# Altium footprint library Microcontroller ARM.PcbLib: 42 footprints (part 2 of 3)
Each footprint in its own frame and in the unit in brackets; x right, y up, seen from the top. Pads: shape width x height; smd on the part's side, far side on the other; paste and mask are expansions set on the pad; w line width, h text height; cw(c..) or ccw(c..) is an arc to the next point about the centre after c.
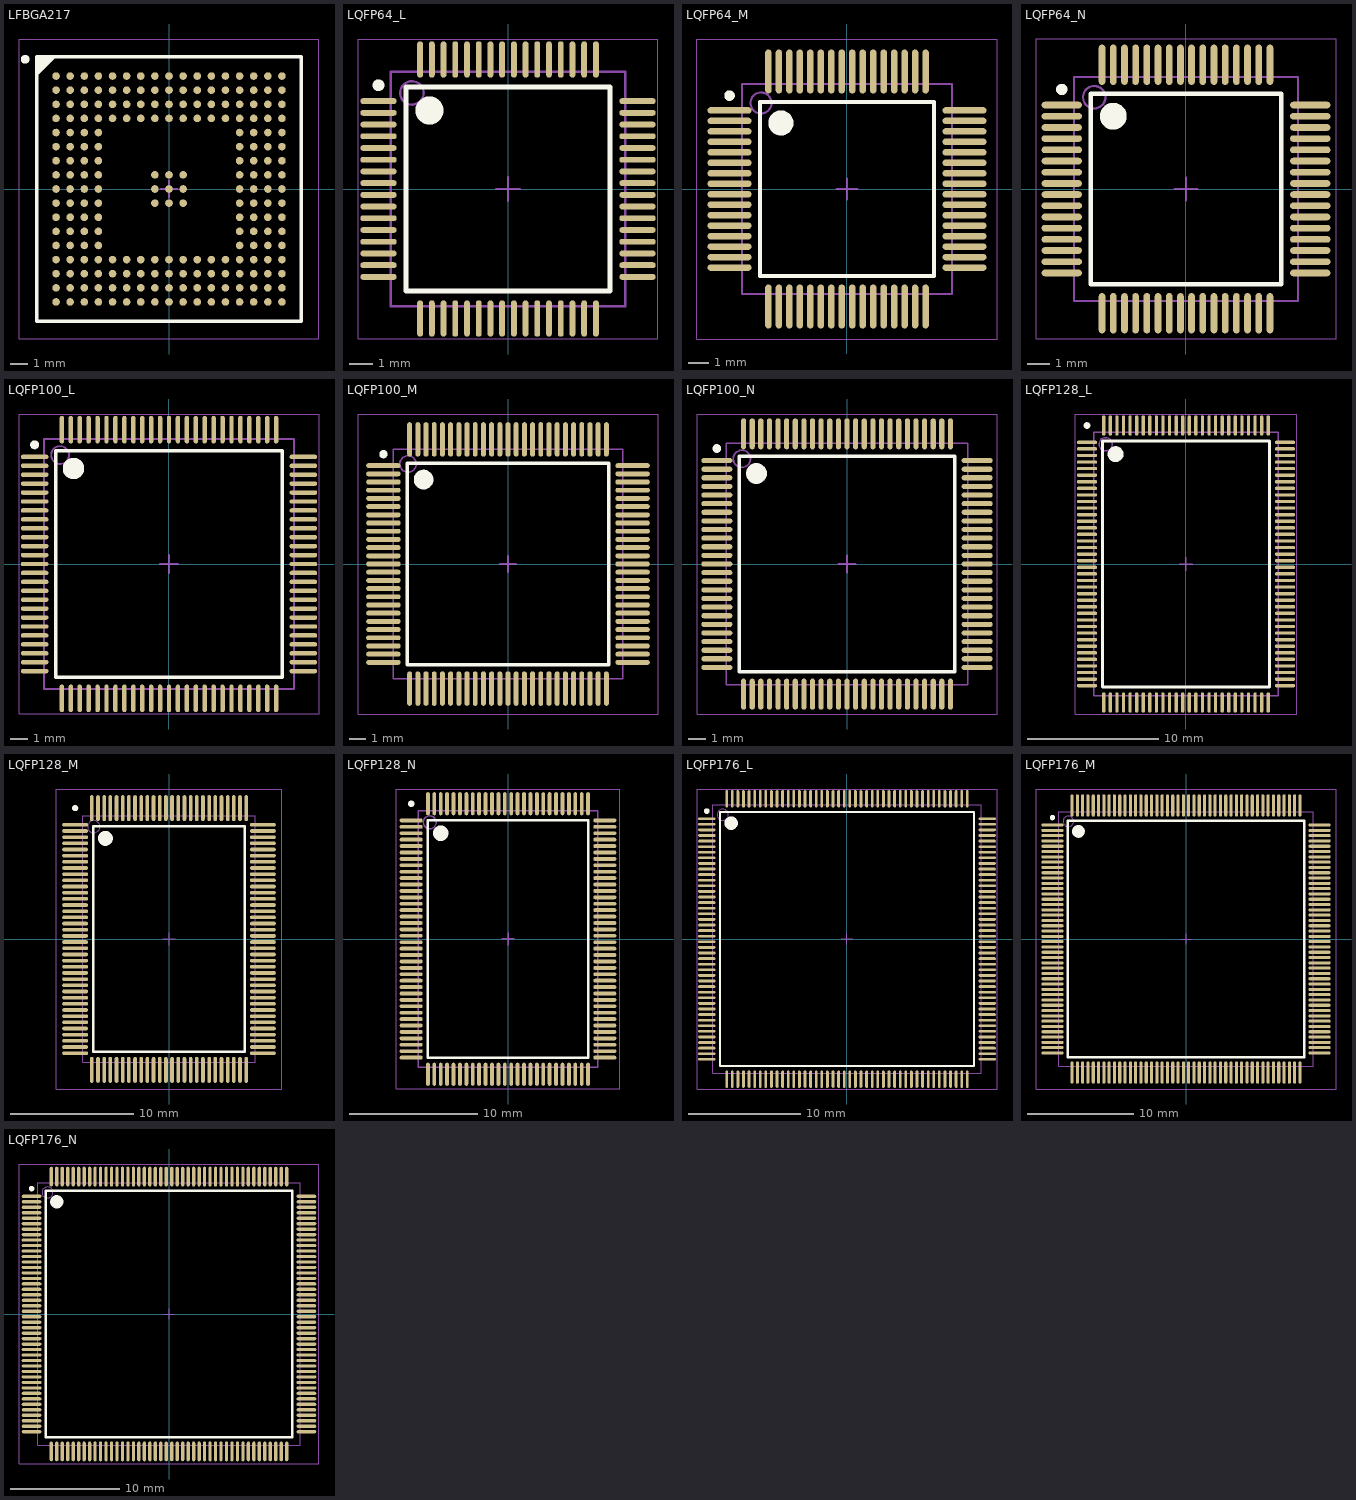
[diagram p1: the footprints below, top view; thin cyan lines are the x and y axes]

## LFBGA217 [mm] "BGA, 208-Leads, Body 15x15mm, Pitch 0.8mmBGA, 208-Leads, Body 15x15mm, Pitch 0.8mm, Solder Mask Defined Pads"
height 1.4
pads (217):
  round 0.43 smd mask-0.065: A1(-6.4,6.4) A2(-5.6,6.4) A3(-4.8,6.4) A4(-4,6.4) A5(-3.2,6.4) A6(-2.4,6.4) A7(-1.6,6.4) A8(-0.8,6.4) A9(0,6.4) A10(0.8,6.4) A11(1.6,6.4) A12(2.4,6.4) A13(3.2,6.4) A14(4,6.4) A15(4.8,6.4) A16(5.6,6.4) A17(6.4,6.4) B1(-6.4,5.6) B2(-5.6,5.6) B3(-4.8,5.6) B4(-4,5.6) B5(-3.2,5.6) B6(-2.4,5.6) B7(-1.6,5.6) B8(-0.8,5.6) B9(0,5.6) B10(0.8,5.6) B11(1.6,5.6) B12(2.4,5.6) B13(3.2,5.6) B14(4,5.6) B15(4.8,5.6) B16(5.6,5.6) B17(6.4,5.6) C1(-6.4,4.8) C2(-5.6,4.8) C3(-4.8,4.8) C4(-4,4.8) C5(-3.2,4.8) C6(-2.4,4.8) C7(-1.6,4.8) C8(-0.8,4.8) C9(0,4.8) C10(0.8,4.8) C11(1.6,4.8) C12(2.4,4.8) C13(3.2,4.8) C14(4,4.8) C15(4.8,4.8) C16(5.6,4.8) C17(6.4,4.8) D1(-6.4,4) D2(-5.6,4) D3(-4.8,4) D4(-4,4) D5(-3.2,4) D6(-2.4,4) D7(-1.6,4) D8(-0.8,4) D9(0,4) D10(0.8,4) D11(1.6,4) D12(2.4,4) D13(3.2,4) D14(4,4) D15(4.8,4) D16(5.6,4) D17(6.4,4) E1(-6.4,3.2) E2(-5.6,3.2) E3(-4.8,3.2) E4(-4,3.2) E14(4,3.2) E15(4.8,3.2) E16(5.6,3.2) E17(6.4,3.2) F1(-6.4,2.4) F2(-5.6,2.4) F3(-4.8,2.4) F4(-4,2.4) F14(4,2.4) F15(4.8,2.4) F16(5.6,2.4) F17(6.4,2.4) G1(-6.4,1.6) G2(-5.6,1.6) G3(-4.8,1.6) G4(-4,1.6) G14(4,1.6) G15(4.8,1.6) G16(5.6,1.6) G17(6.4,1.6) H1(-6.4,0.8) H2(-5.6,0.8) H3(-4.8,0.8) H4(-4,0.8) H8(-0.8,0.8) H9(0,0.8) H10(0.8,0.8) H14(4,0.8) H15(4.8,0.8) H16(5.6,0.8) H17(6.4,0.8) J1(-6.4,0) J2(-5.6,0) J3(-4.8,0) J4(-4,0) J8(-0.8,0) J9(0,0) J10(0.8,0) J14(4,0) J15(4.8,0) J16(5.6,0) J17(6.4,0) K1(-6.4,-0.8) K2(-5.6,-0.8) K3(-4.8,-0.8) K4(-4,-0.8) K8(-0.8,-0.8) K9(0,-0.8) K10(0.8,-0.8) K14(4,-0.8) K15(4.8,-0.8) K16(5.6,-0.8) K17(6.4,-0.8) L1(-6.4,-1.6) L2(-5.6,-1.6) L3(-4.8,-1.6) L4(-4,-1.6) L14(4,-1.6) L15(4.8,-1.6) L16(5.6,-1.6) L17(6.4,-1.6) M1(-6.4,-2.4) M2(-5.6,-2.4) M3(-4.8,-2.4) M4(-4,-2.4) M14(4,-2.4) M15(4.8,-2.4) M16(5.6,-2.4) M17(6.4,-2.4) N1(-6.4,-3.2) N2(-5.6,-3.2) N3(-4.8,-3.2) N4(-4,-3.2) N14(4,-3.2) N15(4.8,-3.2) N16(5.6,-3.2) N17(6.4,-3.2) P1(-6.4,-4) P2(-5.6,-4) P3(-4.8,-4) P4(-4,-4) P5(-3.2,-4) P6(-2.4,-4) P7(-1.6,-4) P8(-0.8,-4) P9(0,-4) P10(0.8,-4) P11(1.6,-4) P12(2.4,-4) P13(3.2,-4) P14(4,-4) P15(4.8,-4) P16(5.6,-4) P17(6.4,-4) R1(-6.4,-4.8) R2(-5.6,-4.8) R3(-4.8,-4.8) R4(-4,-4.8) R5(-3.2,-4.8) R6(-2.4,-4.8) R7(-1.6,-4.8) R8(-0.8,-4.8) R9(0,-4.8) R10(0.8,-4.8) R11(1.6,-4.8) R12(2.4,-4.8) R13(3.2,-4.8) R14(4,-4.8) R15(4.8,-4.8) R16(5.6,-4.8) R17(6.4,-4.8) T1(-6.4,-5.6) T2(-5.6,-5.6) T3(-4.8,-5.6) T4(-4,-5.6) T5(-3.2,-5.6) T6(-2.4,-5.6) T7(-1.6,-5.6) T8(-0.8,-5.6) T9(0,-5.6) T10(0.8,-5.6) T11(1.6,-5.6) T12(2.4,-5.6) T13(3.2,-5.6) T14(4,-5.6) T15(4.8,-5.6) T16(5.6,-5.6) T17(6.4,-5.6) U1(-6.4,-6.4) U2(-5.6,-6.4) U3(-4.8,-6.4) U4(-4,-6.4) U5(-3.2,-6.4) U6(-2.4,-6.4) U7(-1.6,-6.4) U8(-0.8,-6.4) U9(0,-6.4) U10(0.8,-6.4) U11(1.6,-6.4) U12(2.4,-6.4) U13(3.2,-6.4) U14(4,-6.4) U15(4.8,-6.4) U16(5.6,-6.4) U17(6.4,-6.4)
Top Overlay:
  circle w0.25: c-8.15,7.35 r0.125
  region: -6.5,7.5 -7.5,6.5 -7.5,7.5
  lines w0.2: -7.5,6.5 -6.5,7.5 ; -7.5,-7.5 -7.5,7.5 7.5,7.5 7.5,-7.5 -7.5,-7.5
Mechanical 13:
  lines w0.1: -7.5,-7.5 -7.5,7.5 7.5,7.5 7.5,-7.5 -7.5,-7.5
Mechanical 15:
  lines w0.05: -8.5,-8.5 -8.5,8.5 8.5,8.5 8.5,-8.5 -8.5,-8.5
  lines w0.1: -0.5,0 0.5,0 ; 0,-0.5 0,0.5
3D body: height 1.1, standoff 0.3, extent -7.5,-7.5 7.5,7.5
3D body: height 0.38, standoff -0.02, extent 6.203,-5.8 6.597,-5.401
3D body: height 0.38, standoff -0.02, extent 6.203,-6.6 6.597,-6.201
3D body: height 0.38, standoff -0.02, extent 5.403,-5.8 5.797,-5.401
3D body: height 0.38, standoff -0.02, extent 4.603,6.2 4.997,6.599
3D body: height 0.38, standoff -0.02, extent 5.403,-6.6 5.797,-6.201
3D body: height 0.38, standoff -0.02, extent 3.803,3.8 4.197,4.199
3D body: height 0.38, standoff -0.02, extent 4.603,3.8 4.997,4.199
3D body: height 0.38, standoff -0.02, extent 4.603,4.6 4.997,4.999
3D body: height 0.38, standoff -0.02, extent 3.803,4.6 4.197,4.999
3D body: height 0.38, standoff -0.02, extent 4.603,5.4 4.997,5.799
3D body: height 0.38, standoff -0.02, extent 6.203,-5 6.597,-4.601
3D body: height 0.38, standoff -0.02, extent 3.003,-4.2 3.397,-3.801
3D body: height 0.38, standoff -0.02, extent 5.403,-5 5.797,-4.601
3D body: height 0.38, standoff -0.02, extent 2.203,-5 2.597,-4.601
3D body: height 0.38, standoff -0.02, extent 2.203,-4.2 2.597,-3.801
3D body: height 0.38, standoff -0.02, extent 2.203,-6.6 2.597,-6.201
3D body: height 0.38, standoff -0.02, extent 3.003,-6.6 3.397,-6.201
3D body: height 0.38, standoff -0.02, extent 2.203,-5.8 2.597,-5.401
3D body: height 0.38, standoff -0.02, extent 3.003,-5.8 3.397,-5.401
3D body: height 0.38, standoff -0.02, extent 3.003,-5 3.397,-4.601
3D body: height 0.38, standoff -0.02, extent -6.6,4.603 -6.201,4.997
3D body: height 0.38, standoff -0.02, extent -5,4.603 -4.601,4.997
3D body: height 0.38, standoff -0.02, extent -3.4,3.803 -3.001,4.197
3D body: height 0.38, standoff -0.02, extent -2.6,3.803 -2.201,4.197
3D body: height 0.38, standoff -0.02, extent 1.4,-6.597 1.799,-6.203
3D body: height 0.38, standoff -0.02, extent 0.6,-6.597 0.999,-6.203
3D body: height 0.38, standoff -0.02, extent 1.4,-5.797 1.799,-5.403
3D body: height 0.38, standoff -0.02, extent -0.2,-5.797 0.199,-5.403
3D body: height 0.38, standoff -0.02, extent 0.6,-5.797 0.999,-5.403
3D body: height 0.38, standoff -0.02, extent -1.8,-5.797 -1.401,-5.403
3D body: height 0.38, standoff -0.02, extent -1.8,-6.597 -1.401,-6.203
3D body: height 0.38, standoff -0.02, extent -1,-5.797 -0.601,-5.403
3D body: height 0.38, standoff -0.02, extent -1,-6.597 -0.601,-6.203
3D body: height 0.38, standoff -0.02, extent -0.2,-6.597 0.199,-6.203
3D body: height 0.38, standoff -0.02, extent -3.4,-5.797 -3.001,-5.403
3D body: height 0.38, standoff -0.02, extent -2.6,-5.797 -2.201,-5.403
3D body: height 0.38, standoff -0.02, extent -3.4,-6.597 -3.001,-6.203
3D body: height 0.38, standoff -0.02, extent -2.6,-6.597 -2.201,-6.203
3D body: height 0.38, standoff -0.02, extent 1.4,-4.997 1.799,-4.603
3D body: height 0.38, standoff -0.02, extent 0.6,-4.997 0.999,-4.603
3D body: height 0.38, standoff -0.02, extent 1.4,-4.197 1.799,-3.803
3D body: height 0.38, standoff -0.02, extent -0.2,-4.197 0.199,-3.803
3D body: height 0.38, standoff -0.02, extent 0.6,-4.197 0.999,-3.803
3D body: height 0.38, standoff -0.02, extent -1.8,-4.197 -1.401,-3.803
3D body: height 0.38, standoff -0.02, extent -1.8,-4.997 -1.401,-4.603
3D body: height 0.38, standoff -0.02, extent -1,-4.197 -0.601,-3.803
3D body: height 0.38, standoff -0.02, extent -1,-4.997 -0.601,-4.603
3D body: height 0.38, standoff -0.02, extent -0.2,-4.997 0.199,-4.603
3D body: height 0.38, standoff -0.02, extent -3.4,-4.197 -3.001,-3.803
3D body: height 0.38, standoff -0.02, extent -2.6,-4.197 -2.201,-3.803
3D body: height 0.38, standoff -0.02, extent -3.4,-4.997 -3.001,-4.603
3D body: height 0.38, standoff -0.02, extent -2.6,-4.997 -2.201,-4.603
3D body: height 0.38, standoff -0.02, extent -4.997,-6.599 -4.603,-6.2
3D body: height 0.38, standoff -0.02, extent -4.997,-5.799 -4.603,-5.4
3D body: height 0.38, standoff -0.02, extent -4.197,-6.599 -3.803,-6.2
3D body: height 0.38, standoff -0.02, extent -4.197,-4.999 -3.803,-4.6
3D body: height 0.38, standoff -0.02, extent -4.197,-5.799 -3.803,-5.4
3D body: height 0.38, standoff -0.02, extent -4.197,-3.399 -3.803,-3
3D body: height 0.38, standoff -0.02, extent -4.997,-3.399 -4.603,-3
3D body: height 0.38, standoff -0.02, extent -4.197,-4.199 -3.803,-3.8
3D body: height 0.38, standoff -0.02, extent -4.997,-4.199 -4.603,-3.8
3D body: height 0.38, standoff -0.02, extent -4.997,-4.999 -4.603,-4.6
3D body: height 0.38, standoff -0.02, extent -4.197,-1.799 -3.803,-1.4
3D body: height 0.38, standoff -0.02, extent -4.197,-2.599 -3.803,-2.2
3D body: height 0.38, standoff -0.02, extent -4.997,-1.799 -4.603,-1.4
3D body: height 0.38, standoff -0.02, extent -4.997,-2.599 -4.603,-2.2
3D body: height 0.38, standoff -0.02, extent 5.403,-4.199 5.797,-3.8
3D body: height 0.38, standoff -0.02, extent 5.403,-3.399 5.797,-3
3D body: height 0.38, standoff -0.02, extent 6.203,-4.199 6.597,-3.8
3D body: height 0.38, standoff -0.02, extent 6.203,-2.599 6.597,-2.2
3D body: height 0.38, standoff -0.02, extent 6.203,-3.399 6.597,-3
3D body: height 0.38, standoff -0.02, extent 6.203,-0.999 6.597,-0.6
3D body: height 0.38, standoff -0.02, extent 5.403,-0.999 5.797,-0.6
3D body: height 0.38, standoff -0.02, extent 6.203,-1.799 6.597,-1.4
3D body: height 0.38, standoff -0.02, extent 5.403,-1.799 5.797,-1.4
3D body: height 0.38, standoff -0.02, extent 5.403,-2.599 5.797,-2.2
3D body: height 0.38, standoff -0.02, extent 6.203,0.601 6.597,1
3D body: height 0.38, standoff -0.02, extent 6.203,-0.199 6.597,0.2
3D body: height 0.38, standoff -0.02, extent 5.403,0.601 5.797,1
3D body: height 0.38, standoff -0.02, extent 5.403,-0.199 5.797,0.2
3D body: height 0.38, standoff -0.02, extent 5.403,1.401 5.797,1.8
3D body: height 0.38, standoff -0.02, extent 5.403,2.201 5.797,2.6
3D body: height 0.38, standoff -0.02, extent 6.203,1.401 6.597,1.8
3D body: height 0.38, standoff -0.02, extent 6.203,3.001 6.597,3.4
3D body: height 0.38, standoff -0.02, extent 6.203,2.201 6.597,2.6
3D body: height 0.38, standoff -0.02, extent 6.203,4.601 6.597,5
3D body: height 0.38, standoff -0.02, extent 5.403,4.601 5.797,5
3D body: height 0.38, standoff -0.02, extent 6.203,3.801 6.597,4.2
3D body: height 0.38, standoff -0.02, extent 5.403,3.801 5.797,4.2
3D body: height 0.38, standoff -0.02, extent 5.403,3.001 5.797,3.4
3D body: height 0.38, standoff -0.02, extent 6.203,6.201 6.597,6.6
3D body: height 0.38, standoff -0.02, extent 6.203,5.401 6.597,5.8
3D body: height 0.38, standoff -0.02, extent 5.403,6.201 5.797,6.6
3D body: height 0.38, standoff -0.02, extent 5.403,5.401 5.797,5.8
3D body: height 0.38, standoff -0.02, extent -4.997,-0.999 -4.603,-0.6
3D body: height 0.38, standoff -0.02, extent -4.997,-0.199 -4.603,0.2
3D body: height 0.38, standoff -0.02, extent -4.197,-0.999 -3.803,-0.6
3D body: height 0.38, standoff -0.02, extent -4.197,0.601 -3.803,1
3D body: height 0.38, standoff -0.02, extent -4.197,-0.199 -3.803,0.2
3D body: height 0.38, standoff -0.02, extent -4.197,2.201 -3.803,2.6
3D body: height 0.38, standoff -0.02, extent -4.997,2.201 -4.603,2.6
3D body: height 0.38, standoff -0.02, extent -4.197,1.401 -3.803,1.8
3D body: height 0.38, standoff -0.02, extent -4.997,1.401 -4.603,1.8
3D body: height 0.38, standoff -0.02, extent -4.997,0.601 -4.603,1
3D body: height 0.38, standoff -0.02, extent -4.197,3.801 -3.803,4.2
3D body: height 0.38, standoff -0.02, extent -4.197,3.001 -3.803,3.4
3D body: height 0.38, standoff -0.02, extent -4.997,3.801 -4.603,4.2
3D body: height 0.38, standoff -0.02, extent -4.997,3.001 -4.603,3.4
3D body: height 0.38, standoff -0.02, extent 0.603,-0.199 0.997,0.2
3D body: height 0.38, standoff -0.02, extent -0.997,-0.199 -0.603,0.2
3D body: height 0.38, standoff -0.02, extent 0.603,0.601 0.997,1
3D body: height 0.38, standoff -0.02, extent -0.997,-0.999 -0.603,-0.6
3D body: height 0.38, standoff -0.02, extent -0.197,0.601 0.197,1
3D body: height 0.38, standoff -0.02, extent -0.197,-0.999 0.197,-0.6
3D body: height 0.38, standoff -0.02, extent -0.997,0.601 -0.603,1
3D body: height 0.38, standoff -0.02, extent -0.197,-0.199 0.197,0.2
3D body: height 0.38, standoff -0.02, extent 3.803,-6.599 4.197,-6.2
3D body: height 0.38, standoff -0.02, extent 0.603,-0.999 0.997,-0.6
3D body: height 0.38, standoff -0.02, extent 4.603,-5.799 4.997,-5.4
3D body: height 0.38, standoff -0.02, extent 4.603,-6.599 4.997,-6.2
3D body: height 0.38, standoff -0.02, extent 4.603,-4.199 4.997,-3.8
3D body: height 0.38, standoff -0.02, extent 3.803,-4.199 4.197,-3.8
3D body: height 0.38, standoff -0.02, extent 4.603,-4.999 4.997,-4.6
3D body: height 0.38, standoff -0.02, extent 3.803,-4.999 4.197,-4.6
3D body: height 0.38, standoff -0.02, extent 3.803,-5.799 4.197,-5.4
3D body: height 0.38, standoff -0.02, extent 4.603,-2.599 4.997,-2.2
3D body: height 0.38, standoff -0.02, extent 4.603,-3.399 4.997,-3
3D body: height 0.38, standoff -0.02, extent 3.803,-2.599 4.197,-2.2
3D body: height 0.38, standoff -0.02, extent 3.803,-3.399 4.197,-3
3D body: height 0.38, standoff -0.02, extent -6.597,-6.599 -6.203,-6.2
3D body: height 0.38, standoff -0.02, extent -6.597,-5.799 -6.203,-5.4
3D body: height 0.38, standoff -0.02, extent -5.797,-6.599 -5.403,-6.2
3D body: height 0.38, standoff -0.02, extent -5.797,-4.999 -5.403,-4.6
3D body: height 0.38, standoff -0.02, extent -5.797,-5.799 -5.403,-5.4
3D body: height 0.38, standoff -0.02, extent -5.797,-3.399 -5.403,-3
3D body: height 0.38, standoff -0.02, extent -6.597,-3.399 -6.203,-3
3D body: height 0.38, standoff -0.02, extent -5.797,-4.199 -5.403,-3.8
3D body: height 0.38, standoff -0.02, extent -6.597,-4.199 -6.203,-3.8
3D body: height 0.38, standoff -0.02, extent -6.597,-4.999 -6.203,-4.6
3D body: height 0.38, standoff -0.02, extent -5.797,-1.799 -5.403,-1.4
3D body: height 0.38, standoff -0.02, extent -5.797,-2.599 -5.403,-2.2
3D body: height 0.38, standoff -0.02, extent -6.597,-1.799 -6.203,-1.4
3D body: height 0.38, standoff -0.02, extent -6.597,-2.599 -6.203,-2.2
3D body: height 0.38, standoff -0.02, extent 3.803,-1.799 4.197,-1.4
3D body: height 0.38, standoff -0.02, extent 3.803,-0.999 4.197,-0.6
3D body: height 0.38, standoff -0.02, extent 4.603,-1.799 4.997,-1.4
3D body: height 0.38, standoff -0.02, extent 4.603,-0.199 4.997,0.2
3D body: height 0.38, standoff -0.02, extent 4.603,-0.999 4.997,-0.6
3D body: height 0.38, standoff -0.02, extent 4.603,1.401 4.997,1.8
3D body: height 0.38, standoff -0.02, extent 3.803,1.401 4.197,1.8
3D body: height 0.38, standoff -0.02, extent 4.603,0.601 4.997,1
3D body: height 0.38, standoff -0.02, extent 3.803,0.601 4.197,1
3D body: height 0.38, standoff -0.02, extent 3.803,-0.199 4.197,0.2
3D body: height 0.38, standoff -0.02, extent 4.603,3.001 4.997,3.4
3D body: height 0.38, standoff -0.02, extent 4.603,2.201 4.997,2.6
3D body: height 0.38, standoff -0.02, extent 3.803,3.001 4.197,3.4
3D body: height 0.38, standoff -0.02, extent 3.803,2.201 4.197,2.6
3D body: height 0.38, standoff -0.02, extent -6.597,-1.011 -6.203,-0.612
3D body: height 0.38, standoff -0.02, extent -6.597,-0.211 -6.203,0.188
3D body: height 0.38, standoff -0.02, extent -5.797,-1.011 -5.403,-0.612
3D body: height 0.38, standoff -0.02, extent -5.797,0.589 -5.403,0.988
3D body: height 0.38, standoff -0.02, extent -5.797,-0.211 -5.403,0.188
3D body: height 0.38, standoff -0.02, extent -5.797,2.189 -5.403,2.588
3D body: height 0.38, standoff -0.02, extent -6.597,2.189 -6.203,2.588
3D body: height 0.38, standoff -0.02, extent -5.797,1.389 -5.403,1.788
3D body: height 0.38, standoff -0.02, extent -6.597,1.389 -6.203,1.788
3D body: height 0.38, standoff -0.02, extent -6.597,0.589 -6.203,0.988
3D body: height 0.38, standoff -0.02, extent -5.797,3.789 -5.403,4.188
3D body: height 0.38, standoff -0.02, extent -5.797,2.989 -5.403,3.388
3D body: height 0.38, standoff -0.02, extent -6.597,3.789 -6.203,4.188
3D body: height 0.38, standoff -0.02, extent -6.597,2.989 -6.203,3.388
3D body: height 0.38, standoff -0.02, extent -1.799,4.603 -1.4,4.997
3D body: height 0.38, standoff -0.02, extent -0.999,4.603 -0.6,4.997
3D body: height 0.38, standoff -0.02, extent -1.799,3.803 -1.4,4.197
3D body: height 0.38, standoff -0.02, extent -0.199,3.803 0.2,4.197
3D body: height 0.38, standoff -0.02, extent -0.999,3.803 -0.6,4.197
3D body: height 0.38, standoff -0.02, extent 1.401,3.803 1.8,4.197
3D body: height 0.38, standoff -0.02, extent 1.401,4.603 1.8,4.997
3D body: height 0.38, standoff -0.02, extent 0.601,3.803 1,4.197
3D body: height 0.38, standoff -0.02, extent 0.601,4.603 1,4.997
3D body: height 0.38, standoff -0.02, extent -0.199,4.603 0.2,4.997
3D body: height 0.38, standoff -0.02, extent 3.001,3.803 3.4,4.197
3D body: height 0.38, standoff -0.02, extent 2.201,3.803 2.6,4.197
3D body: height 0.38, standoff -0.02, extent 3.001,4.603 3.4,4.997
3D body: height 0.38, standoff -0.02, extent 2.201,4.603 2.6,4.997
3D body: height 0.38, standoff -0.02, extent -0.999,6.203 -0.6,6.597
3D body: height 0.38, standoff -0.02, extent -0.211,6.203 0.188,6.597
3D body: height 0.38, standoff -0.02, extent -0.999,5.403 -0.6,5.797
3D body: height 0.38, standoff -0.02, extent 0.601,5.403 1,5.797
3D body: height 0.38, standoff -0.02, extent -0.199,5.403 0.2,5.797
3D body: height 0.38, standoff -0.02, extent 2.201,5.403 2.6,5.797
3D body: height 0.38, standoff -0.02, extent 2.201,6.203 2.6,6.597
3D body: height 0.38, standoff -0.02, extent 1.401,5.403 1.8,5.797
3D body: height 0.38, standoff -0.02, extent 1.401,6.203 1.8,6.597
3D body: height 0.38, standoff -0.02, extent 0.601,6.203 1,6.597
3D body: height 0.38, standoff -0.02, extent 3.801,5.403 4.2,5.797
3D body: height 0.38, standoff -0.02, extent 2.989,5.403 3.388,5.797
3D body: height 0.38, standoff -0.02, extent 3.801,6.203 4.2,6.597
3D body: height 0.38, standoff -0.02, extent 2.989,6.203 3.388,6.597
3D body: height 0.38, standoff -0.02, extent -2.599,6.203 -2.2,6.597
3D body: height 0.38, standoff -0.02, extent -1.799,6.203 -1.4,6.597
3D body: height 0.38, standoff -0.02, extent -2.599,5.403 -2.2,5.797
3D body: height 0.38, standoff -0.02, extent -3.399,4.603 -3,4.997
3D body: height 0.38, standoff -0.02, extent -2.599,4.603 -2.2,4.997
3D body: height 0.38, standoff -0.02, extent -1.799,5.403 -1.4,5.797
3D body: height 0.38, standoff -0.02, extent -4.999,6.203 -4.6,6.597
3D body: height 0.38, standoff -0.02, extent -4.199,6.203 -3.8,6.597
3D body: height 0.38, standoff -0.02, extent -4.199,5.403 -3.8,5.797
3D body: height 0.38, standoff -0.02, extent -4.199,4.603 -3.8,4.997
3D body: height 0.38, standoff -0.02, extent -3.399,6.203 -3,6.597
3D body: height 0.38, standoff -0.02, extent -3.399,5.403 -3,5.797
3D body: height 0.38, standoff -0.02, extent -5.799,5.403 -5.4,5.797
3D body: height 0.38, standoff -0.02, extent -4.999,5.403 -4.6,5.797
3D body: height 0.38, standoff -0.02, extent -5.799,4.603 -5.4,4.997
3D body: height 0.38, standoff -0.02, extent -6.599,5.403 -6.2,5.797
3D body: height 0.38, standoff -0.02, extent -5.799,6.203 -5.4,6.597
3D body: height 0.38, standoff -0.02, extent -6.599,6.203 -6.2,6.597

## LQFP64_L [mm] "Thin QFP, 64-Leads, Body 10x10mm, Pitch 0.5mm, IPC High Density"
height 1.6
pads (64):
  oval 1.55x0.25 smd: 1(-5.525,3.75) 2(-5.525,3.25) 3(-5.525,2.75) 4(-5.525,2.25) 5(-5.525,1.75) 6(-5.525,1.25) 7(-5.525,0.75) 8(-5.525,0.25) 9(-5.525,-0.25) 10(-5.525,-0.75) 11(-5.525,-1.25) 12(-5.525,-1.75) 13(-5.525,-2.25) 14(-5.525,-2.75) 15(-5.525,-3.25) 16(-5.525,-3.75) 33(5.525,-3.75) 34(5.525,-3.25) 35(5.525,-2.75) 36(5.525,-2.25) 37(5.525,-1.75) 38(5.525,-1.25) 39(5.525,-0.75) 40(5.525,-0.25) 41(5.525,0.25) 42(5.525,0.75) 43(5.525,1.25) 44(5.525,1.75) 45(5.525,2.25) 46(5.525,2.75) 47(5.525,3.25) 48(5.525,3.75)
  oval 0.25x1.55 smd: 17(-3.75,-5.525) 18(-3.25,-5.525) 19(-2.75,-5.525) 20(-2.25,-5.525) 21(-1.75,-5.525) 22(-1.25,-5.525) 23(-0.75,-5.525) 24(-0.25,-5.525) 25(0.25,-5.525) 26(0.75,-5.525) 27(1.25,-5.525) 28(1.75,-5.525) 29(2.25,-5.525) 30(2.75,-5.525) 31(3.25,-5.525) 32(3.75,-5.525) 49(3.75,5.525) 50(3.25,5.525) 51(2.75,5.525) 52(2.25,5.525) 53(1.75,5.525) 54(1.25,5.525) 55(0.75,5.525) 56(0.25,5.525) 57(-0.25,5.525) 58(-0.75,5.525) 59(-1.25,5.525) 60(-1.75,5.525) 61(-2.25,5.525) 62(-2.75,5.525) 63(-3.25,5.525) 64(-3.75,5.525)
Top Overlay:
  circle w0.6: c-3.35,3.35 r0.3
  circle w0.25: c-5.525,4.425 r0.125
  lines w0.2: -4.35,-4.35 4.35,-4.35 4.35,4.35 -4.35,4.35 -4.35,-4.35
Mechanical 13:
  circle w0.1: c-4.1,4.1 r0.5
  lines w0.1: -5,-5 5,-5 5,5 -5,5 -5,-5
Mechanical 15:
  lines w0.05: -6.4,-6.4 6.4,-6.4 6.4,6.4 -6.4,6.4 -6.4,-6.4
  lines w0.1: -0.5,0 0.5,0 ; 0,-0.5 0,0.5
3D body "TQFP64.step": height 1, standoff 0, extent -5.787,-5.79 5.787,5.791

## LQFP64_M [mm] "Thin QFP, 64-Leads, Body 10x10mm, Pitch 0.5mm, IPC Low Density"
height 1.6
pads (64):
  oval 2.1x0.3 smd: 1(-5.6,3.75) 2(-5.6,3.25) 3(-5.6,2.75) 4(-5.6,2.25) 5(-5.6,1.75) 6(-5.6,1.25) 7(-5.6,0.75) 8(-5.6,0.25) 9(-5.6,-0.25) 10(-5.6,-0.75) 11(-5.6,-1.25) 12(-5.6,-1.75) 13(-5.6,-2.25) 14(-5.6,-2.75) 15(-5.6,-3.25) 16(-5.6,-3.75) 33(5.6,-3.75) 34(5.6,-3.25) 35(5.6,-2.75) 36(5.6,-2.25) 37(5.6,-1.75) 38(5.6,-1.25) 39(5.6,-0.75) 40(5.6,-0.25) 41(5.6,0.25) 42(5.6,0.75) 43(5.6,1.25) 44(5.6,1.75) 45(5.6,2.25) 46(5.6,2.75) 47(5.6,3.25) 48(5.6,3.75)
  oval 0.3x2.1 smd: 17(-3.75,-5.6) 18(-3.25,-5.6) 19(-2.75,-5.6) 20(-2.25,-5.6) 21(-1.75,-5.6) 22(-1.25,-5.6) 23(-0.75,-5.6) 24(-0.25,-5.6) 25(0.25,-5.6) 26(0.75,-5.6) 27(1.25,-5.6) 28(1.75,-5.6) 29(2.25,-5.6) 30(2.75,-5.6) 31(3.25,-5.6) 32(3.75,-5.6) 49(3.75,5.6) 50(3.25,5.6) 51(2.75,5.6) 52(2.25,5.6) 53(1.75,5.6) 54(1.25,5.6) 55(0.75,5.6) 56(0.25,5.6) 57(-0.25,5.6) 58(-0.75,5.6) 59(-1.25,5.6) 60(-1.75,5.6) 61(-2.25,5.6) 62(-2.75,5.6) 63(-3.25,5.6) 64(-3.75,5.6)
Top Overlay:
  circle w0.25: c-5.6,4.45 r0.125
  circle w0.6: c-3.15,3.15 r0.3
  lines w0.2: -4.15,-4.15 -4.15,4.15 4.15,4.15 4.15,-4.15 -4.15,-4.15
Mechanical 13:
  circle w0.1: c-4.1,4.1 r0.5
  lines w0.1: -5,-5 -5,5 5,5 5,-5 -5,-5
Mechanical 15:
  lines w0.05: -7.15,-7.15 -7.15,7.15 7.15,7.15 7.15,-7.15 -7.15,-7.15
  lines w0.1: -0.5,0 0.5,0 ; 0,-0.5 0,0.5
3D body "TQFP64.step": height 1, standoff 0, extent -5.787,-5.79 5.787,5.791